# Altium footprint library DrPCB.PcbLib: 910 footprints (part 46 of 57)
Each footprint in its own frame and in the unit in brackets; x right, y up, seen from the top. Pads: shape width x height; smd on the part's side, far side on the other; paste and mask are expansions set on the pad; w line width, h text height; cw(c..) or ccw(c..) is an arc to the next point about the centre after c.
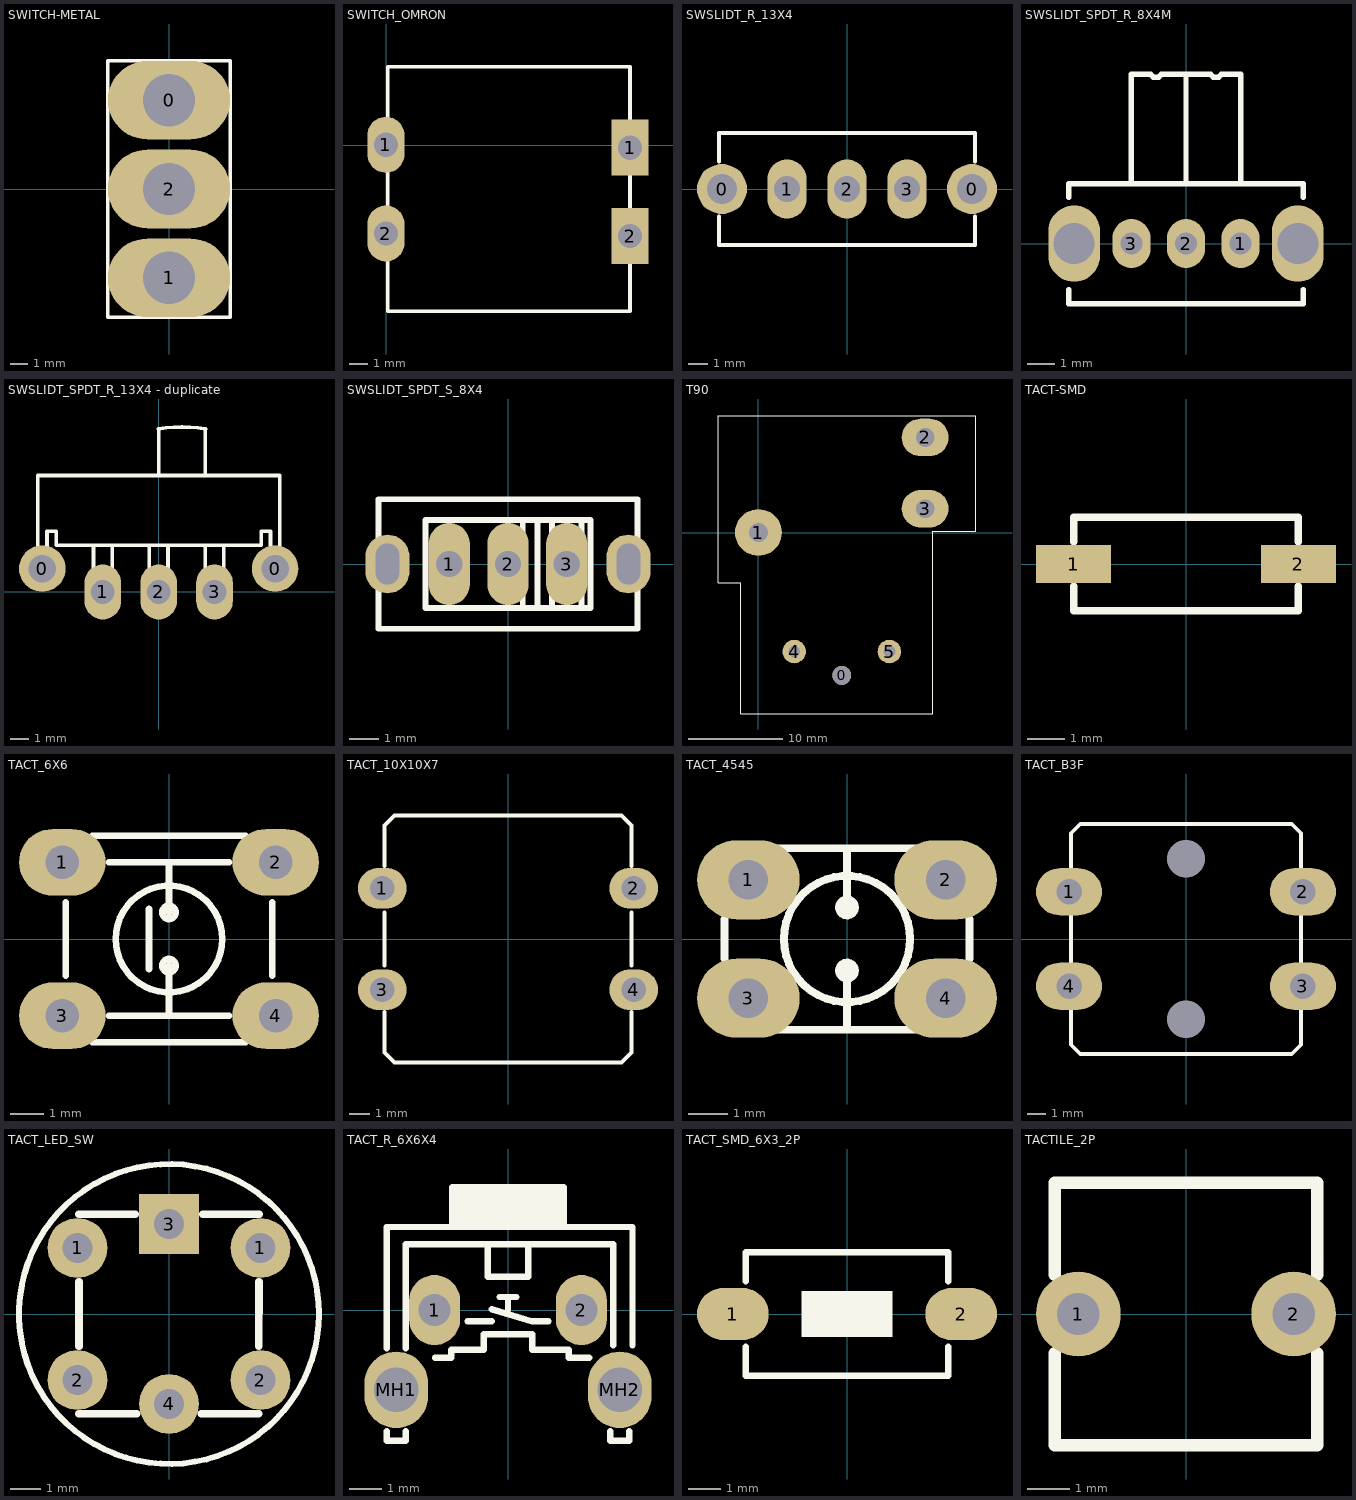
[diagram p45: the footprints below, top view; thin cyan lines are the x and y axes]

## SWITCH-METAL [mm]
pads (3):
  oval 7x4.5 hole 3: 0(0,5.08) 1(0,-5.08) 2(0,0)
Top Overlay:
  lines w0.2: -3.5,-7.33 3.5,-7.33 3.5,7.33 -3.5,7.33 -3.5,-7.33

## SWITCH_OMRON [mm]
pads (4):
  oval 2x3 hole 1.3: 1(-0.023,0.024) 2(-0.023,-4.733)
  rect 2x3 hole 1.3: 1(13.064,-0.128) 2(13.064,-4.871)
Top Overlay:
  lines w0.2: 0.068,-8.908 0.068,4.216 13.058,4.216 13.058,-8.908 0.068,-8.908

## SWSLIDT_R_13X4 [mm] "SWITCH SINGLE POS TO DUAL TERMINAL RIGHT ANGLE"
pads (5):
  round 2.54 hole 1.5: 0(-6.35,0) 0(6.35,0)
  oval 2x3 hole 1.3: 1(-3.048,0) 2(0,0) 3(3.048,0)
Top Overlay:
  lines w0.2: -6.5,-1.399 -6.5,-2.85 6.5,-2.85 6.5,-1.399 ; -6.5,1.407 -6.5,2.85 6.5,2.85 6.5,1.407
3D body "SS-8.step": height 5.6, standoff -3, extent -6.5,-2.749 6.5,8.051

## SWSLIDT_SPDT_R_8X4M [mm] "Subminiator SPDT switch"
pads (5):
  oval 1.4x1.8 hole 0.8: 1(2,0) 2(0,0) 3(-2,0)
  oval 1.9x2.8 hole 1.5: ""(-4.1,0) ""(4.1,0)
Top Overlay:
  lines w0.2: -4.3,-1.7 -4.3,-2.2 4.3,-2.2 4.3,-1.7 ; -4.3,1.7 -4.3,2.2 4.3,2.2 4.3,1.7 ; -2,2.2 -2,6.2 ; 0,2.2 0,6.2 ; 2,2.2 2,6.2 1.3,6.2 1.2,6.1 1,6.1 0.9,6.2 0,6.2 ; -2,6.2 -1.3,6.2 -1.2,6.1 -1,6.1 -0.9,6.2 0,6.2 ; -2,6.2 -2,6.2 ; 0,6.2 0,6.2 ; 0,6.2 0,6.2
3D body "User Library-CK_Slide.step": height 4.7, standoff -2.79, extent -4.311,-2.28 4.3,6.093

## SWSLIDT_SPDT_R_13X4 - duplicate [mm] "SWITCH SINGLE POS TO DUAL TERMINAL RIGHT ANGLE"
pads (5):
  round 2.54 hole 1.5: 0(-6.35,1.27) 0(6.35,1.27)
  oval 2x3 hole 1.3: 1(-3.048,0) 2(0,0) 3(3.048,0)
Top Overlay:
  lines w0.2: -3.556,2.54 -3.556,0 -2.54,0 -2.54,2.54 ; -0.508,2.54 -0.508,0 0.508,0 0.508,2.54 ; -0.028,8.885 cw(c1.27,1.524) 2.568,8.885 ; 0,6.35 0,8.89 ; 2.54,2.54 2.54,0 3.556,0 3.556,2.54 ; 2.54,6.35 2.54,8.89 ; -6.604,1.27 -6.096,1.27 -6.096,3.302 -5.588,3.302 -5.588,2.54 5.588,2.54 5.588,3.302 6.096,3.302 6.096,1.27 6.604,1.27 6.604,6.35 -6.604,6.35 -6.604,1.27
3D body "SS-8.step": height 5.6, standoff -3, extent -6.5,-0.387 6.5,10.413

## SWSLIDT_SPDT_S_8X4 [mm] "Switch, Slide, SPDT, Straight, THD, 8.6X4.3mm"
pads (5):
  oval 1.4x2.8 hole 0.9: 1(-2,0) 2(0,0) 3(2,0)
  oval 1.5x2 hole 0.8 slot 1.4 at 90 deg unplated: ""(-4.1,0) ""(4.1,0)
Top Overlay:
  lines w0.2: -4.4,-0.9 -4.4,-2.2 4.4,-2.2 4.4,-0.9 ; -4.4,0.9 -4.4,2.2 4.4,2.2 4.4,0.9 ; 0.5,-1.5 0.5,-0.8 ; 0.5,0.7 0.5,1.5 ; 1,-1.5 1,1.5 ; 1.5,-1.5 1.5,-0.8 ; 1.5,0.7 1.5,1.5 ; 2,-1.5 2,-1 ; 2,0.9 2,1.5 ; 2.5,-1.5 2.5,-0.8 ; 2.5,0.8 2.5,1.5 ; -2.8,-1.5 -2.8,1.5 2.8,1.5 2.8,-1.5 -2.8,-1.5
3D body "OS102011MS2QN1.stp": height 8.8, standoff -2.7, extent -4.3,-2.15 4.3,2.15

## T90 [mm]
pads (6):
  round 2 hole 2: 0(8.89,-15.24)
  round 5 hole 2: 1(0,0)
  oval 5x4 hole 2: 2(17.78,10.14) 3(17.78,2.54)
  round 2.5 hole 1.25: 4(3.81,-12.7) 5(13.97,-12.7)
Top Overlay:
  lines w0.127: -4.27,-5.36 -4.27,12.44 23.16,12.44 23.16,0.14 18.567,0.14 18.567,-19.36 -1.9,-19.36 -1.9,-5.36 -4.27,-5.36
3D body "User Library-relay_t90_spdt.step": height 20.42, standoff -6.93, extent -4.309,-19.621 23.199,12.586

## TACT-SMD [mm]
pads (2):
  rect 2x1 smd: 1(-3,0) 2(3,0)
Top Overlay:
  lines w0.2: -3,-0.6 -3,-1.25 3,-1.25 3,-0.6 ; -3,0.6 -3,1.25 3,1.25 3,0.6

## TACT_6X6 [mm] "SWITCH, PUSHBUTTON, THD, SPDT, 6X6mm"
pads (4):
  oval 2.6x2 hole 1 mask+0.1: 1(-3.2,2.3) 2(3.2,2.3) 3(-3.2,-2.3) 4(3.2,-2.3)
Top Overlay:
  circle w0.2: c0,0 r1.6
  circle w0.2: c0,0.8 r0.2
  circle w0.2: c0,-0.8 r0.2
  lines w0.2: -3.1,-1.1 -3.1,1.1 ; -2.3,-3.1 2.3,-3.1 ; -2.3,3.1 2.3,3.1 ; -1.8,-2.3 1.8,-2.3 ; -1.8,2.3 1.8,2.3 ; -0.6,-0.9 -0.6,0.9 ; 0,-2.3 0,-0.8 ; 0,0.8 0,2.3 ; 3.1,-1.1 3.1,1.1
3D body "Tactile switch 6x6x5mm.step": height 5.01, standoff -3.51, extent -3.872,-3.015 3.871,3.015

## TACT_10X10X7 [mm] "SWITCH, PUSHBUTTON, THD, SPDT,"
pads (4):
  oval 2.4x2 hole 1.2 mask+0.1: 1(-6.2,2.5) 2(6.2,2.5) 3(-6.2,-2.5) 4(6.2,-2.5)
Top Overlay:
  lines w0.2: -6.1,-3.6 -6.1,-5.6 -5.6,-6.1 5.6,-6.1 6.1,-5.6 6.1,-3.6 ; -6.1,-1.3 -6.1,1.3 ; -6.1,3.6 -6.1,5.6 -5.6,6.1 5.6,6.1 6.1,5.6 6.1,3.6 ; 6.1,-1.3 6.1,1.3
3D body "User Library-SWT9-1.STEP": height 7.3, standoff -3.5, extent -6.5,-6 6.5,6

## TACT_4545 [mm] "SWITCH, PUSHBUTTON, THD, SPDT, 6X6mm"
pads (4):
  oval 2.6x2 hole 1 mask+0.1: 1(-2.5,1.5) 2(2.5,1.5) 3(-2.5,-1.5) 4(2.5,-1.5)
Top Overlay:
  circle w0.2: c0,0 r1.6
  circle w0.2: c0,0.8 r0.2
  circle w0.2: c0,-0.8 r0.2
  lines w0.2: -3.1,-0.5 -3.1,0.5 ; -1.8,-2.3 1.8,-2.3 ; -1.8,2.3 1.8,2.3 ; 0,-2.3 0,-0.8 ; 0,0.8 0,2.3 ; 3.1,-0.5 3.1,0.5

## TACT_B3F [mm] "SWITCH, PUSHBUTTON, THD, SPDT,"
pads (6):
  oval 3.5x2.5 hole 1.35 mask+0.1: 1(-6.2,2.5) 2(6.2,2.5) 3(6.2,-2.5) 4(-6.2,-2.5)
  round 1.8 hole 2 unplated: ""(0,-4.25) ""(0,4.25)
Top Overlay:
  lines w0.2: -6.1,-3.6 -6.1,-5.6 -5.6,-6.1 5.6,-6.1 6.1,-5.6 6.1,-3.6 ; -6.1,-1.3 -6.1,1.3 ; -6.1,3.6 -6.1,5.6 -5.6,6.1 5.6,6.1 6.1,5.6 6.1,3.6 ; 6.1,-1.3 6.1,1.3
3D body "User Library-SWT9-1.STEP": height 7.3, standoff -3.5, extent -6.5,-6 6.5,6

## TACT_LED_SW [mm]
pads (6):
  round 2 hole 1: 1(-3.05,2.2) 1(3.05,2.2) 2(-3.05,-2.2) 2(3.05,-2.2) 4(0,-3)
  rect 2x2 hole 1: 3(0,3)
Top Overlay:
  circle w0.2: c0,0 r5
  lines w0.254: -3.001,-3.327 -1.084,-3.327 ; -3.001,-1.079 -2.999,1.079 ; -3.001,3.327 -1.132,3.327 ; 1.079,-3.327 2.997,-3.327 ; 1.13,3.327 3,3.327 ; 2.997,-1.079 3,1.079

## TACT_R_6X6X4 [mm] "SWITCH, PUSHBUTTON, THD, SPST, 6X6X3.85 mm; 1,000,000 cycles ; 0.98N Force, SKHHLMA010"
height 7.4
pads (4):
  oval 1.6x2.2 hole 1 mask+0.1: 1(-2.3,0) 2(2.3,0)
  oval 2x2.4 hole 1.4 mask+0.1: MH1(-3.5,-2.5) MH2(3.5,-2.5)
Top Overlay:
  region: 1.75,3.85 -1.75,3.85 -1.75,2.6 1.75,2.6
  lines w0.2: -3.8,-3.8 -3.8,-4.1 -3.2,-4.1 -3.2,-3.8 ; -3.8,-1.2 -3.8,2.6 3.9,2.6 3.9,-1.1 ; -3.2,-1.2 -3.2,2.057 -0.635,2.057 ; -2.286,-1.499 -1.778,-1.499 -1.778,-1.245 -0.762,-1.245 -0.762,-0.762 0.762,-0.762 0.762,-1.245 1.905,-1.245 1.905,-1.499 2.54,-1.499 ; -1.75,2.6 -1.75,3.85 1.75,3.85 1.75,2.6 ; -1.27,-0.356 -0.508,-0.356 ; -0.508,0.025 0.762,-0.356 1.27,-0.356 ; -0.254,0.406 0,0.406 ; 0,0.025 0,0.406 ; 0.254,0.406 0,0.406 ; 3.2,-3.8 3.2,-4.1 3.8,-4.1 3.8,-3.8 ; 3.3,-1.1 3.3,2.057 0.635,2.057 ; -0.635,2.057 0.635,2.057 ; -0.635,2.057 -0.635,1.041 0.635,1.041 0.635,2.057
3D body "SKHHLM.STEP": height 7.43, standoff -3.47, extent -4.248,-4.042 4.248,3.858

## TACT_SMD_6X3_2P [mm]
pads (2):
  oval 2.2x1.6 smd mask+0.1: 1(-3.5,0) 2(3.5,0)
Top Overlay:
  region: 1.4,0.7 -1.4,0.7 -1.4,-0.7 1.4,-0.7
  lines w0.2: -3.1,-1 -3.1,-1.9 3.1,-1.9 3.1,-1 ; -3.1,1 -3.1,1.9 3.1,1.9 3.1,1
3D body "User Library-Tact switch 1181_3.step": height 2.51, standoff 0.01, extent -4,-1.8 4,1.8

## TACTILE_2P [mm]
pads (2):
  round 2 hole 1: 1(-2.54,0) 2(2.54,0)
Top Overlay:
  lines w0.3: -3.1,-0.927 -3.1,-3.1 3.1,-3.1 3.1,-0.927 ; -3.1,0.927 -3.1,3.1 3.1,3.1 3.1,0.927
3D body "Tactile Switch.STEP": height 4.51, standoff -3.99, extent -3.1,-3.1 3.1,3.1